# Altium footprint library PERCRO_footprints.PcbLib: 177 footprints (part 1 of 12)
Each footprint in its own frame and in the unit in brackets; x right, y up, seen from the top. Pads: shape width x height; smd on the part's side, far side on the other; paste and mask are expansions set on the pad; w line width, h text height; cw(c..) or ccw(c..) is an arc to the next point about the centre after c.
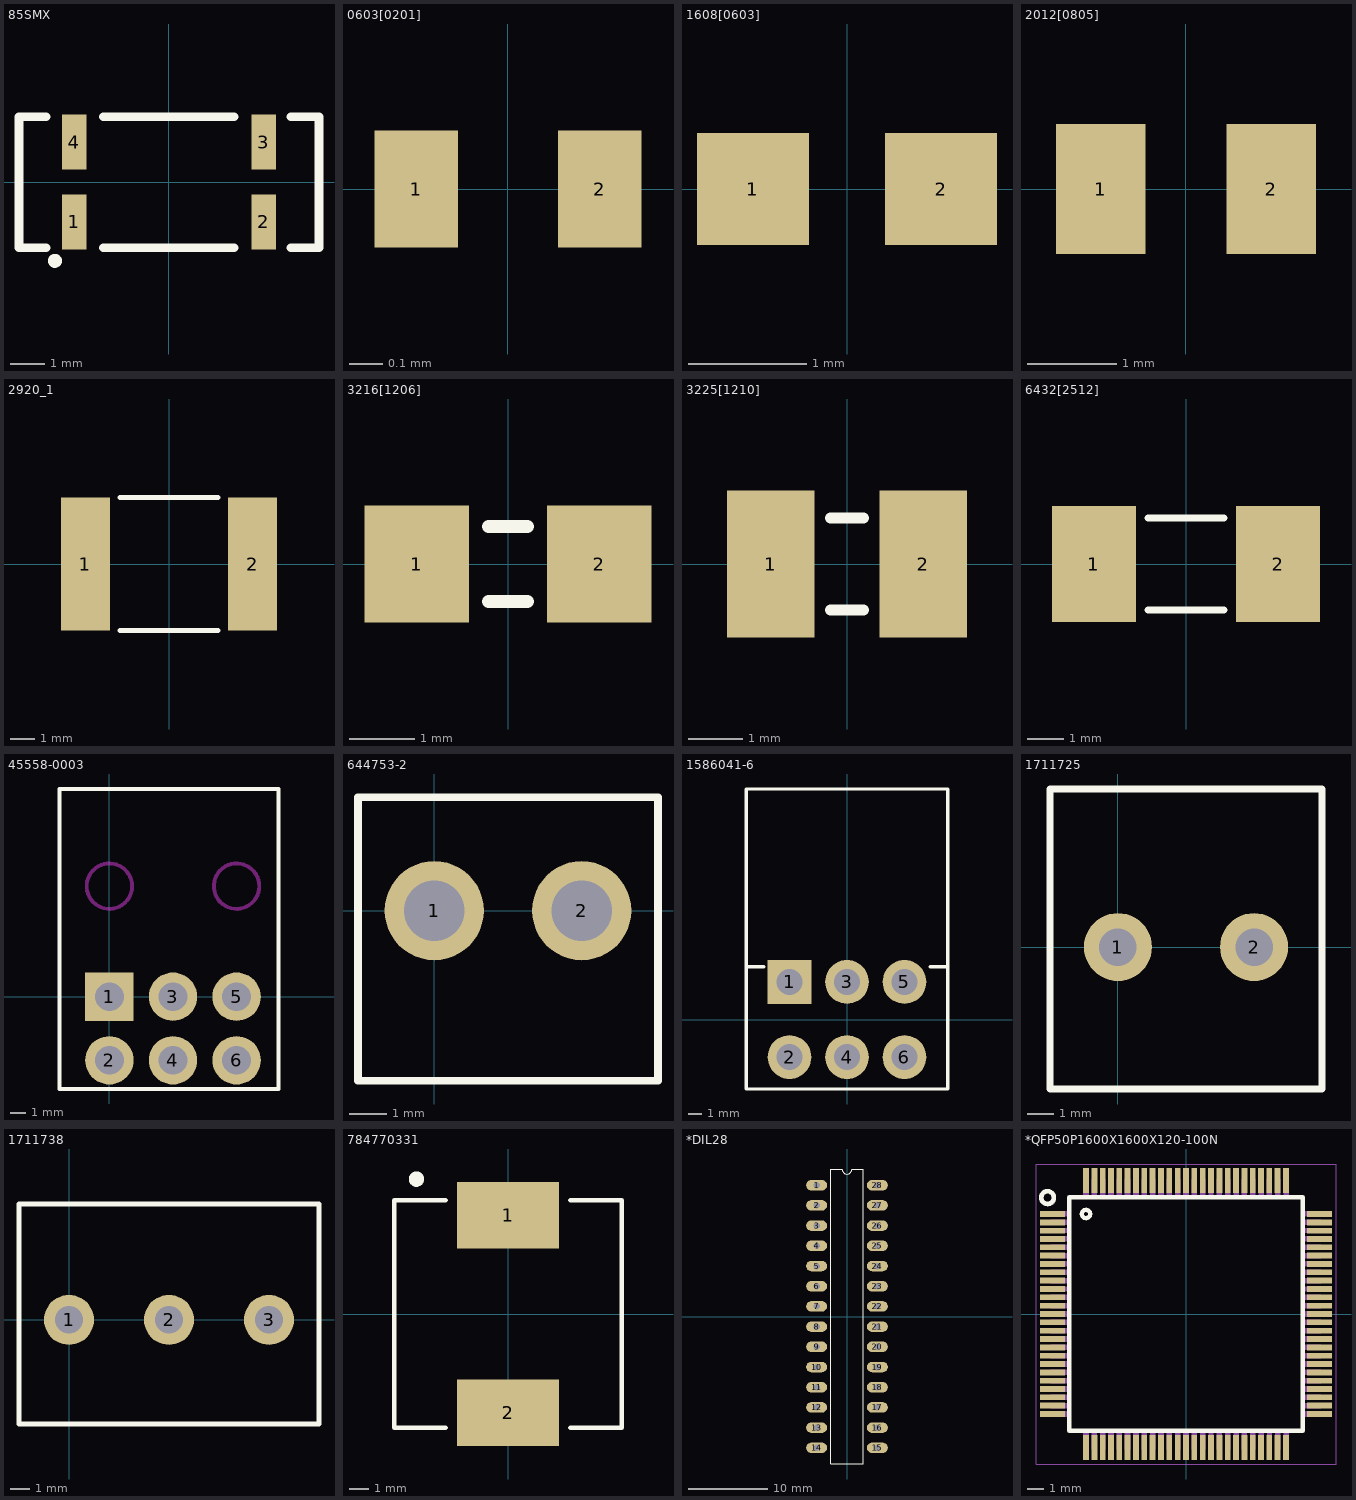
[diagram p0: the footprints below, top view; thin cyan lines are the x and y axes]

## 85SMX [mil] "XTAL SMD"
pads (4):
  rect 28x63 smd: 1(-108.27,-45.28) 2(109,-45.28) 3(109,46) 4(-108.27,46)
Top Overlay:
  circle w10: c-130.16,-89.76 r3
  lines w10: -140,-74.8 -171.26,-74.8 -171.26,0 -171.26,75 -140,75 ; -75,-75 75,-75 ; -75,75 75,75 ; 140,-74.8 172,-74.8 172,75 140,75
3D body "85SMX.step": height 99.61, standoff 0, extent -157.47,-74.8 157.49,74.81

## 0603[0201] [mm] "metric[imperial]"
pads (2):
  rect 0.25x0.35 smd: 1(-0.275,0) 2(0.275,0)
3D body: height 0.25, standoff 0, extent -0.305,-0.152 0.305,0.153

## 1608[0603] [mm]
pads (2):
  rect 0.95x0.95 smd: 1(-0.8,0) 2(0.8,0)
3D body "R 1608[0603].step": height 0.4, standoff 0, extent -0.8,-0.4 0.8,0.4

## 2012[0805] [mm]
pads (2):
  rect 1x1.45 smd: 1(-0.95,0) 2(0.95,0)
3D body "R 2012[0805].step": height 0.5, standoff 0, extent -1.076,-0.599 0.924,0.65

## 2920_1 [mm]
height 0.7
pads (2):
  rect 2x5.4 smd: 1(-3.4,0) 2(3.4,0)
Top Overlay:
  lines w0.2: -2,-2.7 2,-2.7 ; -2,2.7 2,2.7
3D body "2920.STEP": height 1.05, standoff 0, extent -3.677,-2.585 3.678,2.585

## 3216[1206] [mm] "Chip-Resistor"
pads (2):
  rect 1.6x1.8 smd: 1(-1.4,0) 2(1.4,0)
Top Overlay:
  lines w0.2: -0.3,-0.574 0.3,-0.574 ; -0.3,0.574 0.3,0.574
3D body "Res 1206.step": height 0.54, standoff -0.01, extent -1.6,-0.8 1.6,0.8

## 3225[1210] [mm]
pads (2):
  rect 1.6x2.7 smd: 1(-1.4,0) 2(1.4,0)
Top Overlay:
  lines w0.2: -0.3,-0.846 0.3,-0.846 ; -0.3,0.846 0.3,0.846
3D body "Res 1210 (3225).step": height 0.57, standoff 0, extent -1.55,-1.295 1.55,1.307

## 6432[2512] [mil] "SMD_resistor"
pads (2):
  rect 91x126 smd: 1(-100,0) 2(100,0)
Top Overlay:
  lines w7.87: -41,-50 41,-50 ; -41,50 41,50
3D body "Res 1210 (3225).step": height 22.24, standoff 0, extent -61.02,-50 61.02,52.44

## 45558-0003 [mm] "CONN HEADER R/A 6POS 4.2MM"
pads (6):
  rect 3.2x3.2 hole 1.9: 1(0,0)
  round 3.2 hole 1.9: 2(0,-4.2) 3(4.2,0) 4(4.2,-4.2) 5(8.4,0) 6(8.4,-4.2)
Top Overlay:
  lines w0.254: -3.302,-6.096 11.176,-6.096 11.176,13.716 -3.302,13.716 -3.302,-6.096
Keep-Out Layer:
  circle w0.254: c8.4,7.3 r1.5
  circle w0.254: c0,7.3 r1.5
3D body "HEADER_6POS_4.2MM.step": height 11.1, standoff -3.6, extent -3.2,-4.73 11.1,13.7

## 644753-2 [mil] "Header"
pads (2):
  round 105 hole 64: 1(0,0) 2(156,0)
Top Overlay:
  lines w8: -80.71,-180 236.71,-180 236.71,120 -80.71,120 -80.71,-180
3D body "MTA-156.stp": height 525, standoff -175, extent -78,-180.5 234,119.5

## 1586041-6 [mm] "CONN HEADER R/A 6POS 4.2MM"
pads (6):
  rect 3.2x3.2 hole 1.9: 1(-4.2,2.75)
  round 3.2 hole 1.9: 2(-4.2,-2.75) 3(0,2.75) 4(0,-2.75) 5(4.2,2.75) 6(4.2,-2.75)
Top Overlay:
  lines w0.254: -7.366,3.85 -6.096,3.85 ; 6.096,3.85 7.366,3.85 ; -7.366,-5.08 7.366,-5.08 7.366,16.85 -7.366,16.85 -7.366,-5.08
3D body "c-1586041-6-b-3d.stp": height 11.65, standoff -3.15, extent -7.4,-3.285 6.9,16.85

## 1711725 [mm] "PCB terminal 2 pos"
pads (2):
  round 2.54 hole 1.4: 1(0,0) 2(5.08,0)
Top Overlay:
  lines w0.254: -2.54,-5.3 -2.54,5.9 7.62,5.9 7.62,-5.3 -2.54,-5.3
3D body "pxc_1711725_05_MKDS-3-2-5-08_3D.stp": height 18.3, standoff -5, extent -3.11,-5.283 7.62,5.917

## 1711738 [mm] "PCB terminal 3 pos"
pads (3):
  round 2.54 hole 1.4: 1(0,0) 2(5.08,0) 3(10.16,0)
Top Overlay:
  lines w0.254: -2.54,-5.3 12.7,-5.3 12.7,5.9 -2.54,5.9 -2.54,-5.3
3D body "pxc_1711738_05_MKDS-3-3-5-08_3D.stp": height 18.3, standoff -5, extent -3.11,-5.36 12.7,5.82

## 784770331 [mm] "Inductor Wurth Elektronik"
height 0.206
pads (2):
  rect 5.4x3.5 smd: 1(0,5.207) 2(0,-5.207)
Top Overlay:
  circle w0.406: c-4.826,7.112 r0.203
  lines w0.254: -3.302,-6 -6,-6 -6,6 -3.302,6 ; 3.302,-6 6,-6 6,6 3.302,6
3D body: height 8.1, standoff 0, extent -5.994,-6.045 6.02,5.969

## *DIL28 [mil]
pads (28):
  oval 104x52 hole 32: 1(-150,650) 2(-150,550) 3(-150,450) 4(-150,350) 5(-150,250) 6(-150,150) 7(-150,50) 8(-150,-50) 9(-150,-150) 10(-150,-250) 11(-150,-350) 12(-150,-450) 13(-150,-550) 14(-150,-650) 15(150,-650) 16(150,-550) 17(150,-450) 18(150,-350) 19(150,-250) 20(150,-150) 21(150,-50) 22(150,50) 23(150,150) 24(150,250) 25(150,350) 26(150,450) 27(150,550) 28(150,650)
Top Overlay:
  lines w5: -80,-730 -80,730 -25,730 ccw(c0,730) 25,730 80,730 80,-730 -80,-730

## *QFP50P1600X1600X120-100N [mm]
pads (100):
  rect 1.5x0.35 smd: 1(-8,6) 2(-8,5.5) 3(-8,5) 4(-8,4.5) 5(-8,4) 6(-8,3.5) 7(-8,3) 8(-8,2.5) 9(-8,2) 10(-8,1.5) 11(-8,1) 12(-8,0.5) 13(-8,0) 14(-8,-0.5) 15(-8,-1) 16(-8,-1.5) 17(-8,-2) 18(-8,-2.5) 19(-8,-3) 20(-8,-3.5) 21(-8,-4) 22(-8,-4.5) 23(-8,-5) 24(-8,-5.5) 25(-8,-6) 51(8,-6) 52(8,-5.5) 53(8,-5) 54(8,-4.5) 55(8,-4) 56(8,-3.5) 57(8,-3) 58(8,-2.5) 59(8,-2) 60(8,-1.5) 61(8,-1) 62(8,-0.5) 63(8,0) 64(8,0.5) 65(8,1) 66(8,1.5) 67(8,2) 68(8,2.5) 69(8,3) 70(8,3.5) 71(8,4) 72(8,4.5) 73(8,5) 74(8,5.5) 75(8,6)
  rect 0.35x1.5 smd: 26(-6,-8) 27(-5.5,-8) 28(-5,-8) 29(-4.5,-8) 30(-4,-8) 31(-3.5,-8) 32(-3,-8) 33(-2.5,-8) 34(-2,-8) 35(-1.5,-8) 36(-1,-8) 37(-0.5,-8) 38(0,-8) 39(0.5,-8) 40(1,-8) 41(1.5,-8) 42(2,-8) 43(2.5,-8) 44(3,-8) 45(3.5,-8) 46(4,-8) 47(4.5,-8) 48(5,-8) 49(5.5,-8) 50(6,-8) 76(6,8) 77(5.5,8) 78(5,8) 79(4.5,8) 80(4,8) 81(3.5,8) 82(3,8) 83(2.5,8) 84(2,8) 85(1.5,8) 86(1,8) 87(0.5,8) 88(0,8) 89(-0.5,8) 90(-1,8) 91(-1.5,8) 92(-2,8) 93(-2.5,8) 94(-3,8) 95(-3.5,8) 96(-4,8) 97(-4.5,8) 98(-5,8) 99(-5.5,8) 100(-6,8)
Top Overlay:
  circle w0.279: c-8.306,6.985 r0.381
  circle w0.254: c-6,6 r0.25
  lines w0.254: -7,-7 -7,7 7,7 7,-7 -7,-7
Mechanical 4:
  drawing of 200 lines, arcs and shapes, not listed
Mechanical 16:
  lines w0.05: -9,-9 -9,9 9,9 9,-9 -9,-9
3D body "ATMEGA_2560.step": height 1.11, standoff 0.01, extent -7.975,-8 8.025,8